# Altium footprint library ZabugorLib.PcbLib: 48 footprints (part 3 of 3)
Each footprint in its own frame and in the unit in brackets; x right, y up, seen from the top. Pads: shape width x height; smd on the part's side, far side on the other; paste and mask are expansions set on the pad; w line width, h text height; cw(c..) or ccw(c..) is an arc to the next point about the centre after c.
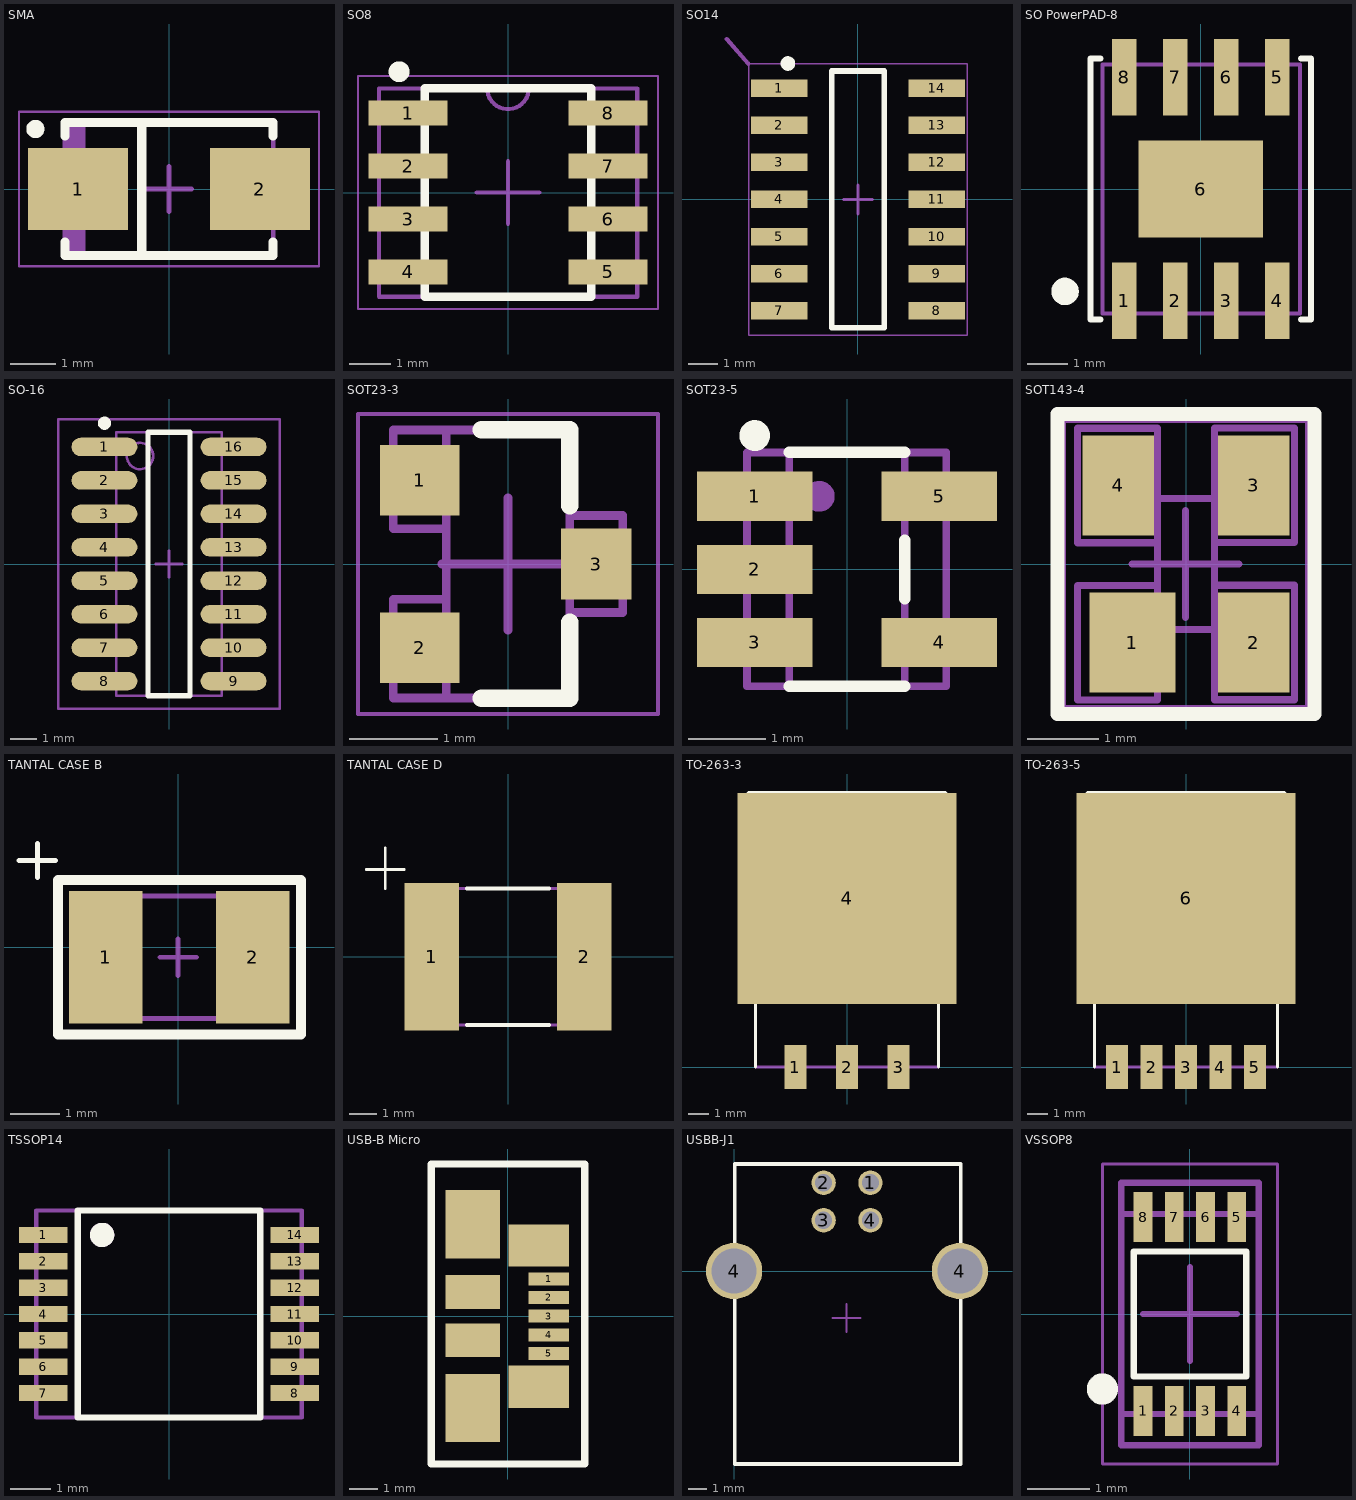
[diagram p2: the footprints below, top view; thin cyan lines are the x and y axes]

## SMA [mm]
height 2.67
pads (2):
  rect 2.2x1.8 smd: 1(-2,0) 2(2,0)
Top Overlay:
  circle w0.2: c-2.94,1.32 r0.1
  lines w0.2: -2.29,-1.17 -2.29,-1.46 2.29,-1.46 2.29,-1.17 ; -2.29,1.17 -2.29,1.46 2.29,1.46 2.29,1.17 ; -0.6,-1.45 -0.6,1.45
Mechanical 9:
  text ".Designator" at -0.75,0.25 h1
  text ".Comment" at -0.75,-0.5 h0.8
Mechanical 11:
  lines w0.1: -2.29,-0.82 -2.8,-0.82 -2.8,0.82 -2.29,0.82 ; -2.19,-1.44 -2.19,1.46 ; -2.09,-1.44 -2.09,1.46 ; -1.99,-1.44 -1.99,1.46 ; -1.89,-1.44 -1.89,1.46 ; 2.29,-0.82 2.8,-0.82 2.8,0.82 2.29,0.82 ; -2.29,-1.46 2.29,-1.46 2.29,1.46 -2.29,1.46 -2.29,-1.46
Mechanical 15:
  lines w0.05: -3.3,-1.7 -3.3,1.7 3.3,1.7 3.3,-1.7 -3.3,-1.7
  lines w0.1: -0.5,0 0.5,0 ; 0,-0.5 0,0.5
3D body "User Library-DO-214AC_SMA.step": height 2.15, standoff -0.05, extent -2.5,-1.35 2.5,1.35

## SO8 [mm]
height 1.75
pads (8):
  rect 1.9x0.6 smd: 1(-2.4,1.905) 2(-2.4,0.635) 3(-2.4,-0.635) 4(-2.4,-1.905) 5(2.4,-1.905) 6(2.4,-0.635) 7(2.4,0.635) 8(2.4,1.905)
Top Overlay:
  circle w0.25: c-2.615,2.9 r0.125
  lines w0.2: -2,-2.5 2,-2.5 2,2.5 -2,2.5 ; -2,-2.475 -2,2.475
Mechanical 9:
  text ".Designator" at -0.75,0.25 h1
  text ".Comment" at -0.75,-0.5 h0.8
Mechanical 11:
  lines w0.1: -2,-2.5 -2,2.5 ; -0.5,2.5 ccw(c0,2.5) 0.5,2.5 ; 2,-2.5 2,2.5 ; -3.1,-2.5 -3.1,2.5 3.1,2.5 3.1,-2.5 -3.1,-2.5
Mechanical 15:
  lines w0.05: -3.6,-2.8 3.6,-2.8 3.6,2.8 -3.6,2.8 -3.6,-2.8
  lines w0.1: -0.75,0 0.75,0 ; 0,-0.75 0,0.75
3D body "SOIC-8.STEP": height 1.7, standoff 0, extent -3,-2.54 3,2.54

## SO14 [mm] "SOIC, 14-Leads, Body 8,65x3,90mm, Pitch 1,27mm, IPC Medium Density"
height 1.75
pads (14):
  rect 1.946x0.6 smd: 1(-2.7,3.81) 2(-2.7,2.54) 3(-2.7,1.27) 4(-2.7,0) 5(-2.7,-1.27) 6(-2.7,-2.54) 7(-2.7,-3.81) 8(2.7,-3.81) 9(2.7,-2.54) 10(2.7,-1.27) 11(2.7,0) 12(2.7,1.27) 13(2.7,2.54) 14(2.7,3.81)
Top Overlay:
  circle w0.25: c-2.4,4.66 r0.125
  lines w0.2: -0.9,-4.4 -0.9,4.4 0.9,4.4 0.9,-4.4 -0.9,-4.4
Mechanical 9:
  text ".Designator" at -2.225,5.725 h0.8
  text ".Comment" at -1.75,5.05 h0.6
Mechanical 11:
  lines w0.05: -3.75,-4.65 -3.75,4.65 3.75,4.65 3.75,-4.65 -3.75,-4.65
  lines w0.1: -0.5,0 0.5,0 ; 0,-0.5 0,0.5
  lines w0.15: -4.5,5.5 -3.75,4.65
3D body "User Library-SOIC14-150.step": height 1.75, standoff 0, extent -2.9,-4.275 2.9,4.275

## SO PowerPAD-8 [mm]
pads (9):
  rect 0.61x1.91 smd: 1(-1.905,-2.78) 2(-0.635,-2.78) 3(0.635,-2.78) 4(1.905,-2.78) 5(1.905,2.78) 6(0.635,2.78) 7(-0.635,2.78) 8(-1.905,2.78)
  rect 3.1x2.41 smd: 6(0,0)
Top Overlay:
  circle w0.254: c-3.402,-2.55 r0.127
  circle w0.254: c-3.377,-2.55 r0.215
  lines w0.15: -2.5,-3.25 -2.75,-3.25 -2.75,3.25 -2.5,3.25 ; 2.5,-3.25 2.75,-3.25 2.75,3.25 2.5,3.25
Mechanical 7:
  lines w0.1: -2.45,-3.1 2.475,-3.1 2.475,3.1 -2.45,3.1 -2.45,-3.1
3D body "CircuitWorks-SO-8.step": height 1.45, standoff 0, extent -2.451,-2.925 2.451,2.853

## SO-16 [mm] "16-Pin Small Outline Integrated Circuit 1.27 mm Pitch, IPC Low Density"
height 1.75
pads (16):
  oval 2.5x0.7 smd: 1(-2.45,4.445) 2(-2.45,3.175) 3(-2.45,1.905) 4(-2.45,0.635) 5(-2.45,-0.635) 6(-2.45,-1.905) 7(-2.45,-3.175) 8(-2.45,-4.445) 9(2.45,-4.445) 10(2.45,-3.175) 11(2.45,-1.905) 12(2.45,-0.635) 13(2.45,0.635) 14(2.45,1.905) 15(2.45,3.175) 16(2.45,4.445)
Top Overlay:
  circle w0.25: c-2.45,5.345 r0.125
  lines w0.2: -0.8,-5 0.8,-5 0.8,5 -0.8,5 -0.8,-5
Mechanical 13:
  circle w0.1: c-1.1,4.1 r0.5
  lines w0.1: -2,-5 2,-5 2,5 -2,5 -2,-5
Mechanical 15:
  lines w0.1: -0.5,0 0.5,0 ; 0,-0.5 0,0.5 ; -4.2,-5.5 4.2,-5.5 4.2,5.5 -4.2,5.5 -4.2,-5.5
3D body "so16-1 (SOT109-1).STEP": height 1.78, standoff 0.01, extent -3.068,-4.985 3.068,4.985

## SOT23-3 [mm]
height 1.12
pads (3):
  rect 0.9x0.8 smd: 1(-1,0.95) 2(-1,-0.95)
  rect 0.8x0.8 smd: 3(1,0)
Top Overlay:
  lines w0.2: -0.3,-1.52 0.7,-1.52 0.7,-0.66 ; -0.3,1.52 0.7,1.52 0.7,0.66
Mechanical 9:
  text ".Designator" at -0.75,0.25 h1
  text ".Comment" at -0.75,-0.5 h0.8
Mechanical 11:
  lines w0.1: -0.7,-1.52 -0.7,1.52 ; -0.7,-0.4 -1.3,-0.4 -1.3,-1.52 0.7,-1.52 0.7,1.52 -1.3,1.52 -1.3,0.4 -0.7,0.4 ; 0.7,-0.55 1.3,-0.55 1.3,0.55 0.7,0.55
Mechanical 15:
  lines w0.05: -1.7,-1.7 1.7,-1.7 1.7,1.7 -1.7,1.7 -1.7,-1.7
  lines w0.1: -0.75,0 0.75,0 ; 0,-0.75 0,0.75
3D body "SOT-23-3.STEP": height 1.1, standoff 0, extent -1.15,-1.5 1.15,1.5

## SOT23-5 [mm]
height 1.12
pads (5):
  rect 1.5x0.64 smd: 1(-1.2,0.95) 2(-1.2,0) 3(-1.2,-0.95) 4(1.2,-0.95) 5(1.2,0.95)
Top Overlay:
  circle w0.2: c-1.2,1.74 r0.1
  lines w0.15: -0.75,-1.52 0.75,-1.52 ; -0.75,1.52 0.75,1.52 ; 0.75,-0.38 0.75,0.38
Mechanical 7:
  circle w0.2: c-0.36,0.95 r0.1
  lines w0.1: -0.75,-1.52 -0.75,1.52 ; 0.75,-1.52 0.75,1.52 ; -1.3,-1.52 1.29,-1.52 1.29,1.52 -1.3,1.52 -1.3,-1.52
Mechanical 10:
  text ".Designator" at -0.73,1.79 h0.8
  text ".Comment" at -0.95,-2.13 h0.6
3D body "User Library-SOT23-5-3.STEP": height 1.45, standoff 0.01, extent -1.6,-1.555 1.6,1.545

## SOT143-4 [mm]
height 1.12
pads (4):
  rect 1.2x1.4 smd: 1(-0.75,-1.1)
  rect 1x1.4 smd: 2(0.95,-1.1) 3(0.95,1.1) 4(-0.95,1.1)
Top Overlay:
  lines w0.2: -1.8,-2.1 -1.8,2.1 1.8,2.1 1.8,-2.1 -1.8,-2.1
Mechanical 9:
  text ".Designator" at 10.287,-3.937 h1
  text ".Comment" at 11.049,-3.175 h0.8
Mechanical 11:
  lines w0.1: -0.4,-0.917 0.4,-0.917 ; -0.4,-0.9 -0.4,1.9 -1.518,1.9 -1.518,0.297 -0.4,0.297 ; -0.4,0.917 0.4,0.917 ; 0.4,0.3 1.518,0.3 1.518,1.903 0.4,1.903 ; 0.4,1.9 0.4,-0.297 ; 0.4,-0.297 1.518,-0.297 1.518,-1.9 0.4,-1.9 0.4,-0.297 ; -1.518,-1.903 -1.518,-0.3 -0.4,-0.3 -0.4,-1.903 -1.518,-1.903
Mechanical 15:
  lines w0.05: -1.706,-2 1.694,-2 1.694,2 -1.706,2 -1.706,-2
  lines w0.1: -0.756,0 0.744,0 ; -0.006,-0.75 -0.006,0.75
3D body "User Library-sot143.step": height 1, standoff 0, extent -1.46,-1.21 1.46,1.21

## TANTAL CASE B [mm] "Конденсатор электролитический танталовый"
height 2.5
pads (2):
  rect 1.5x2.7 smd: 1(-1.475,-0.2) 2(1.525,-0.2)
Top Overlay:
  lines w0.1: -3.25,1.775 -2.5,1.775 ; -2.875,1.425 -2.875,2.125
  lines w0.2: -2.455,-1.78 2.505,-1.78 2.505,1.38 -2.455,1.38 -2.455,-1.78
Mechanical 9:
  text ".Designator" at -1.25,0 h1
  text ".Comment" at -1.25,-0.75 h0.8
Mechanical 11:
  lines w0.1: -1.575,-1.45 -1.575,1.05 1.625,1.05 1.625,-1.45 -1.575,-1.45
Mechanical 15:
  lines w0.05: -2.455,-1.78 -2.455,1.38 2.505,1.38 2.505,-1.78 -2.455,-1.78
  lines w0.1: -0.375,-0.2 0.375,-0.2 ; 0,-0.575 0,0.175
3D body "User Library-CaseB_3528-21.step": height 1.9, standoff 0, extent -1.7,-1.6 1.8,1.2

## TANTAL CASE D [mm] "Конденсатор танталовый SMD"
height 1.8
pads (2):
  rect 2x5.4 smd: 1(-2.8,0) 2(2.8,0)
Top Overlay:
  lines w0.1: -5.2,3.2 -3.8,3.2 ; -4.5,2.5 -4.5,4
  lines w0.15: -1.5,-2.5 1.5,-2.5 ; -1.5,2.5 1.5,2.5
Mechanical 7:
  lines w0.1: -2.8,-2.5 2.8,-2.5 2.8,2.5 -2.8,2.5 -2.8,-2.5
Mechanical 10:
  text ".Comment" at -0.47,-3.45 h0.6
  text ".Designator" at -0.56,3.04 h0.8
3D body "User Library-CAP_TANT_7343-40.step": height 4, standoff 0, extent -3.8,-2.3 3.8,2.3

## TO-263-3 [mm]
pads (4):
  rect 1.07x2.16 smd: 1(-2.54,0) 2(0,0) 3(2.54,0)
  rect 10.8x10.41 smd: 4(0,8.315)
Top Overlay:
  lines w0.15: -5.258,12.27 5.232,12.27 ; -4.51,0 -4.51,3.7 ; 4.51,0 4.51,3.7 ; -5.258,3.7 -5.258,13.142 -4.86,13.54 4.86,13.54 5.232,13.168 5.232,3.7 -5.258,3.7
Mechanical 7:
  lines w0.15: -5.25,12.27 -5.25,3.7 5.25,3.7 5.25,12.27 ; -4.51,3.7 -4.51,0 4.51,0 4.51,3.7 ; -5.1,12.27 5.232,12.27 3.962,13.54 -3.96,13.54 -5.1,12.4 -5.1,12.27
Mechanical 10:
  text ".Designator" at -1.3,-2.8 h0.7
  text ".Comment" at -1.3,17 h0.7
3D body "User Library-D?PAK TO-263-3.step": height 4.87, standoff 0, extent -5.07,-0.89 5.09,13.34

## TO-263-5 [mm]
pads (6):
  rect 1.07x2.16 smd: 1(-3.4,0) 2(-1.7,0) 3(0,0) 4(1.7,0) 5(3.4,0)
  rect 10.8x10.41 smd: 6(0,8.315)
Top Overlay:
  lines w0.15: -5.258,12.27 5.232,12.27 ; -4.51,0 -4.51,3.7 ; 4.51,0 4.51,3.7 ; -5.258,3.7 5.232,3.7 5.232,13.168 4.86,13.54 -4.86,13.54 -5.258,13.142 -5.258,3.7
Mechanical 7:
  lines w0.15: -5.25,12.27 -5.25,3.7 5.25,3.7 5.25,12.27 ; -4.51,3.7 -4.51,0 4.51,0 4.51,3.7 ; -5.1,12.27 -5.1,12.4 -3.96,13.54 3.962,13.54 5.232,12.27 -5.1,12.27
Mechanical 10:
  text ".Comment" at -1.3,17 h0.7
  text ".Designator" at -1.3,-2.8 h0.7
3D body: height 4.58, standoff 0, extent -5.08,-0.9 5.1,13.45

## TSSOP14 [mm]
height 1.1
pads (14):
  rect 1.2x0.4 smd: 1(-3.1,1.95) 2(-3.1,1.3) 3(-3.1,0.65) 4(-3.1,0) 5(-3.1,-0.65) 6(-3.1,-1.3) 7(-3.1,-1.95) 8(3.1,-1.95) 9(3.1,-1.3) 10(3.1,-0.65) 11(3.1,0) 12(3.1,0.65) 13(3.1,1.3) 14(3.1,1.95)
Top Overlay:
  circle w0.3: c-1.65,1.95 r0.15
  lines w0.15: -2.25,-2.55 2.25,-2.55 2.25,2.55 -2.25,2.55 -2.25,-2.55
Mechanical 7:
  circle w0.3: c-1.65,1.95 r0.15
  lines w0.1: -2.25,-2.55 -2.25,2.55 ; 2.25,-2.55 2.25,2.55 ; -3.275,-2.55 -3.275,2.55 3.275,2.55 3.275,-2.55 -3.275,-2.55
Mechanical 10:
  text ".Designator" at -1.2,2.925 h0.8
  text ".Comment" at -1,-3.175 h0.6
3D body "User Library-TSSOP-14.STEP": height 1.2, standoff 0, extent -3.2,-2.5 3.2,2.5

## USB-B Micro [mm]
pads (11):
  rect 1.4x0.45 smd: 1(1.425,1.3) 2(1.425,0.65) 3(1.425,0) 4(1.425,-0.65) 5(1.425,-1.3)
  rect 1.9x2.375 smd: ""(-1.225,-3.2) ""(-1.225,3.2)
  rect 1.9x1.175 smd: ""(-1.225,-0.837) ""(-1.225,0.837)
  rect 2.1x1.475 smd: ""(1.075,-2.462) ""(1.075,2.462)
Top Overlay:
  lines w0.254: -2.665,-5.15 2.675,-5.15 2.675,5.3 -2.665,5.3 -2.665,-5.15
3D body "micro-B USB.STEP": height 2.64, standoff -0.28, extent -3.925,-3.974 1.501,4

## USBB-J1 [mm]
pads (6):
  round 1.3 hole 0.92: 1(7.27,4.71) 2(4.77,4.71) 3(4.77,2.71) 4(7.27,2.71)
  round 3 hole 2.4: 4(0,0) 4(12.04,0)
Top Overlay:
  lines w0.2: 12.04,5.71 0.04,5.71 0.04,-10.29 12.08,-10.29 12.08,5.71
Mechanical 9:
  text ".Comment" at 5.25,-3.25 h0.8
  text ".Designator" at 5.25,-2.25 h1
Mechanical 11:
  lines w0.1: 12.04,5.71 0.04,5.71 0.04,-10.29 12.08,-10.29 12.08,5.71
Mechanical 15:
  lines w0.05: 12,5.71 0,5.71 0,-10.29 12.04,-10.29 12.04,5.71
  lines w0.1: 5.25,-2.5 6.75,-2.5 ; 6,-3.25 6,-1.75
3D body "User Library-Samtec - USB-B-S-X-W-TH.STEP": height 11, standoff -3.64, extent -1.398,-10.3 13.4,6.2

## VSSOP8 [mm]
height 1.75
pads (8):
  rect 0.3x0.8 smd mask+0.1: 1(-0.75,-1.55)
  rect 0.3x0.8 smd: 2(-0.25,-1.55) 3(0.25,-1.55) 4(0.75,-1.55) 5(0.75,1.55) 6(0.25,1.55) 7(-0.25,1.55) 8(-0.75,1.55)
Top Overlay:
  circle w0.25: c-1.4,-1.2 r0.125
  lines w0.1: -0.9,-1 -0.9,1 0.9,1 0.9,-1 -0.9,-1
Mechanical 9:
  text ".Comment" at 0.5,-0.75 h0.8
  text ".Designator" at -0.25,-0.75 h1
Mechanical 11:
  lines w0.1: -1.1,-1.6 1.1,-1.6 ; -1.1,1.6 1.1,1.6 ; -1.1,-2.1 -1.1,2.1 1.1,2.1 1.1,-2.1 -1.1,-2.1
Mechanical 15:
  lines w0.05: -1.4,-2.4 -1.4,2.4 1.4,2.4 1.4,-2.4 -1.4,-2.4
  lines w0.1: -0.75,0 0.75,0 ; 0,-0.75 0,0.75
3D body "User Library-SOP50P310X90-8N[8US8_VSSOP_DCU_MO-187CA].step": height 0.9, standoff 0, extent -1.05,-1.6 1.05,1.6